# Altium footprint library lib_datalogger.PcbLib: 866 footprints (part 34 of 55)
Each footprint in its own frame and in the unit in brackets; x right, y up, seen from the top. Pads: shape width x height; smd on the part's side, far side on the other; paste and mask are expansions set on the pad; w line width, h text height; cw(c..) or ccw(c..) is an arc to the next point about the centre after c.
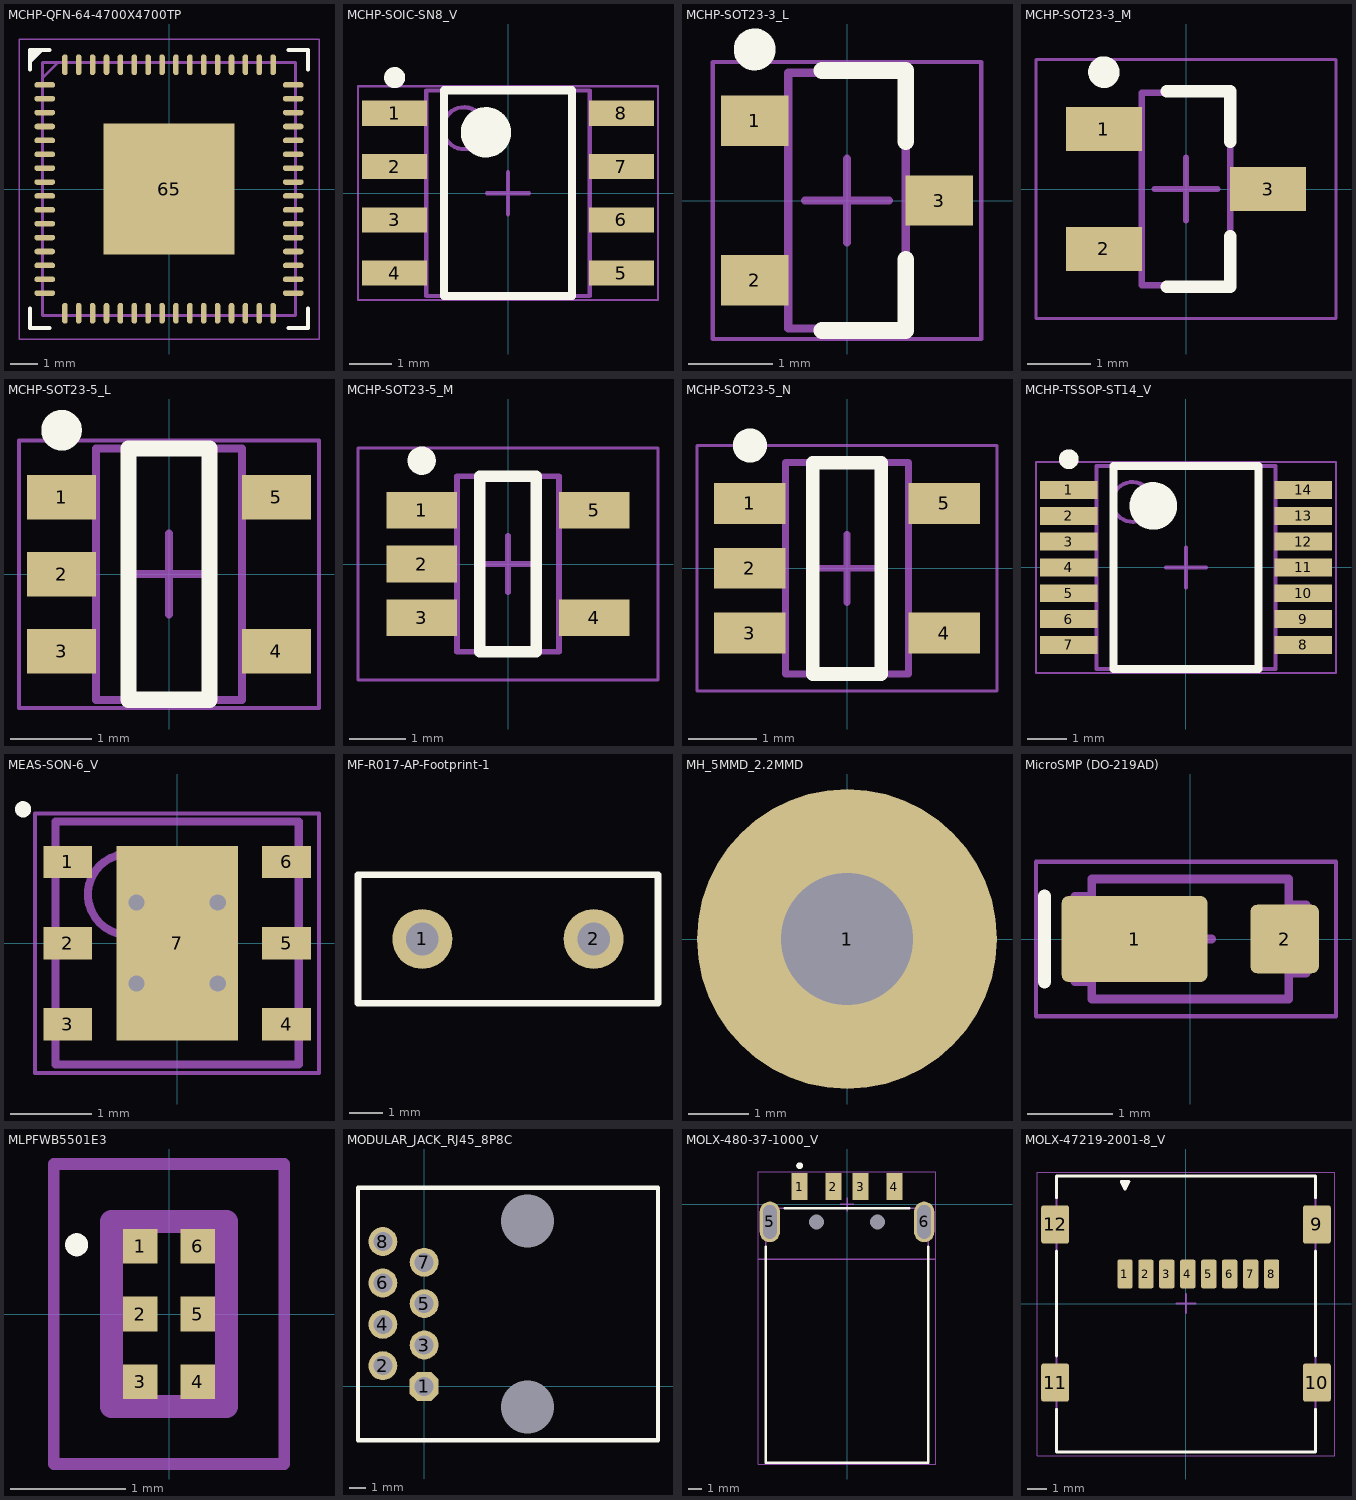
[diagram p33: the footprints below, top view; thin cyan lines are the x and y axes]

## MCHP-QFN-64-4700X4700TP [mm] "QFN, 64-Leads, Body 9.1x9.1mm, Pitch 0.5mm, Thermal Pad 4.7x4.7mm"
height 1
pads (65):
  oval 0.75x0.2 smd: 1(-4.475,3.75) 2(-4.475,3.25) 3(-4.475,2.75) 4(-4.475,2.25) 5(-4.475,1.75) 6(-4.475,1.25) 7(-4.475,0.75) 8(-4.475,0.25) 9(-4.475,-0.25) 10(-4.475,-0.75) 11(-4.475,-1.25) 12(-4.475,-1.75) 13(-4.475,-2.25) 14(-4.475,-2.75) 15(-4.475,-3.25) 16(-4.475,-3.75) 33(4.475,-3.75) 34(4.475,-3.25) 35(4.475,-2.75) 36(4.475,-2.25) 37(4.475,-1.75) 38(4.475,-1.25) 39(4.475,-0.75) 40(4.475,-0.25) 41(4.475,0.25) 42(4.475,0.75) 43(4.475,1.25) 44(4.475,1.75) 45(4.475,2.25) 46(4.475,2.75) 47(4.475,3.25) 48(4.475,3.75)
  oval 0.2x0.75 smd: 17(-3.75,-4.475) 18(-3.25,-4.475) 19(-2.75,-4.475) 20(-2.25,-4.475) 21(-1.75,-4.475) 22(-1.25,-4.475) 23(-0.75,-4.475) 24(-0.25,-4.475) 25(0.25,-4.475) 26(0.75,-4.475) 27(1.25,-4.475) 28(1.75,-4.475) 29(2.25,-4.475) 30(2.75,-4.475) 31(3.25,-4.475) 32(3.75,-4.475) 49(3.75,4.475) 50(3.25,4.475) 51(2.75,4.475) 52(2.25,4.475) 53(1.75,4.475) 54(1.25,4.475) 55(0.75,4.475) 56(0.25,4.475) 57(-0.25,4.475) 58(-0.75,4.475) 59(-1.25,4.475) 60(-1.75,4.475) 61(-2.25,4.475) 62(-2.75,4.475) 63(-3.25,4.475) 64(-3.75,4.475)
  rect 4.7x4.7 smd: 65(0,0)
Top Overlay:
  region: -5,5 -5,4.6 -4.6,5
  lines w0.15: -5,-4.3 -5,-5 -4.3,-5 ; -5,4.3 -5,5 -4.3,5 ; -5,4.6 -4.6,5 ; 4.3,-5 5,-5 5,-4.3 ; 4.3,5 5,5 5,4.3
Mechanical 13:
  lines w0.1: -4.55,4 -4,4.55 ; -4.55,-4.55 4.55,-4.55 4.55,4.55 -4.55,4.55 -4.55,-4.55
Mechanical 15:
  lines w0.05: -5.4,-5.4 5.4,-5.4 5.4,5.4 -5.4,5.4 -5.4,-5.4
  lines w0.1: -0.5,0 0.5,0 ; 0,-0.5 0,0.5
Top Designator:
  text ".Designator" at -1.778,3.175 h0.6
3D body "QFN64-9x9-pad4d7.step": height 0.9, standoff 0, extent -4.51,-4.51 4.51,4.51

## MCHP-SOIC-SN8_V [mm] "SOIC, 8-Leads, Body 4.90x3.90mm, Pitch 1.27mm"
height 1.75
pads (8):
  rect 1.55x0.6 smd: 1(-2.7,1.905) 2(-2.7,0.635) 3(-2.7,-0.635) 4(-2.7,-1.905) 5(2.7,-1.905) 6(2.7,-0.635) 7(2.7,0.635) 8(2.7,1.905)
Top Overlay:
  circle w0.25: c-2.7,2.755 r0.125
  circle w0.6: c-0.525,1.45 r0.3
  lines w0.2: -1.525,-2.45 -1.525,2.45 1.525,2.45 1.525,-2.45 -1.525,-2.45
Mechanical 13:
  circle w0.1: c-1.05,1.55 r0.5
  lines w0.1: -1.95,-2.45 -1.95,2.45 1.95,2.45 1.95,-2.45 -1.95,-2.45
Mechanical 15:
  lines w0.05: -3.575,-2.55 -3.575,2.55 3.575,2.55 3.575,-2.55 -3.575,-2.55
  lines w0.1: -0.5,0 0.5,0 ; 0,-0.5 0,0.5
3D body "SOIC127P600X175-8L.step": height 1.75, standoff 0, extent -3.01,-2.45 3.01,2.45

## MCHP-SOT23-3_L [mm] "SOT23, 3-Leads, Body 3.05x1.4mm, Pitch 0.95mm, IPC High Density"
height 1.12
pads (3):
  rect 0.8x0.6 smd: 1(-1.1,0.95) 2(-1.1,-0.95) 3(1.1,0)
Top Overlay:
  circle w0.25: c-1.1,1.8 r0.125
  lines w0.2: -0.3,-1.55 0.7,-1.55 0.7,-0.7 ; -0.3,1.55 0.7,1.55 0.7,0.7
Mechanical 13:
  lines w0.1: -0.7,-1.525 0.7,-1.525 0.7,1.525 -0.7,1.525 -0.7,-1.525
Mechanical 15:
  lines w0.05: -1.6,-1.65 1.6,-1.65 1.6,1.65 -1.6,1.65 -1.6,-1.65
  lines w0.1: -0.5,0 0.5,0 ; 0,-0.5 0,0.5
3D body "SOT95P237X112-3N.step": height 1.12, standoff 0, extent -1.39,-1.525 1.39,1.525

## MCHP-SOT23-3_M [mm] "SOT23, 3-Leads, Body 3.05x1.4mm, Pitch 0.95mm, IPC Low Density"
height 1.12
pads (3):
  rect 1.2x0.7 smd: 1(-1.3,0.95) 2(-1.3,-0.95) 3(1.3,0)
Top Overlay:
  circle w0.25: c-1.3,1.85 r0.125
  lines w0.2: -0.3,-1.55 0.7,-1.55 0.7,-0.75 ; -0.3,1.55 0.7,1.55 0.7,0.75
Mechanical 13:
  lines w0.1: -0.7,-1.525 0.7,-1.525 0.7,1.525 -0.7,1.525 -0.7,-1.525
Mechanical 15:
  lines w0.05: -2.375,-2.05 2.375,-2.05 2.375,2.05 -2.375,2.05 -2.375,-2.05
  lines w0.1: -0.5,0 0.5,0 ; 0,-0.5 0,0.5
3D body "SOT95P237X112-3N.step": height 1.12, standoff 0, extent -1.39,-1.525 1.39,1.525

## MCHP-SOT23-5_L [mm] "SOT23, 5-Leads, Body 3.10x1.80mm, Pitch 0.95mm, IPC High Density"
height 1.45
pads (5):
  rect 0.85x0.55 smd: 1(-1.325,0.95) 2(-1.325,0) 3(-1.325,-0.95) 4(1.325,-0.95) 5(1.325,0.95)
Top Overlay:
  circle w0.25: c-1.325,1.775 r0.125
  lines w0.2: -0.5,-1.55 0.5,-1.55 0.5,1.55 -0.5,1.55 -0.5,-1.55
Mechanical 13:
  lines w0.1: -0.9,-1.55 -0.9,1.55 0.9,1.55 0.9,-1.55 -0.9,-1.55
Mechanical 15:
  lines w0.05: -1.85,-1.65 -1.85,1.65 1.85,1.65 1.85,-1.65 -1.85,-1.65
  lines w0.1: -0.5,0 0.5,0 ; 0,-0.5 0,0.5
3D body "SOT95P270X145-5L.step": height 1.45, standoff 0, extent -1.7,-1.55 1.7,1.55

## MCHP-SOT23-5_M [mm] "SOT23, 5-Leads, Body 3.10x1.80mm, Pitch 0.95mm, IPC Low Density"
height 1.45
pads (5):
  rect 1.25x0.65 smd: 1(-1.525,0.95) 2(-1.525,0) 3(-1.525,-0.95) 4(1.525,-0.95) 5(1.525,0.95)
Top Overlay:
  circle w0.25: c-1.525,1.825 r0.125
  lines w0.2: -0.5,-1.55 -0.5,1.55 0.5,1.55 0.5,-1.55 -0.5,-1.55
Mechanical 13:
  lines w0.1: -0.9,-1.55 0.9,-1.55 0.9,1.55 -0.9,1.55 -0.9,-1.55
Mechanical 15:
  lines w0.05: -2.65,-2.05 2.65,-2.05 2.65,2.05 -2.65,2.05 -2.65,-2.05
  lines w0.1: -0.5,0 0.5,0 ; 0,-0.5 0,0.5
3D body "SOT95P270X145-5M.step": height 1.45, standoff 0, extent -1.7,-1.55 1.7,1.55

## MCHP-SOT23-5_N [mm] "SOT23, 5-Leads, Body 3.10x1.80mm, Pitch 0.95mm, IPC Medium Density"
height 1.45
pads (5):
  rect 1.05x0.6 smd: 1(-1.425,0.95) 2(-1.425,0) 3(-1.425,-0.95) 4(1.425,-0.95) 5(1.425,0.95)
Top Overlay:
  circle w0.25: c-1.425,1.8 r0.125
  lines w0.2: -0.5,-1.55 -0.5,1.55 0.5,1.55 0.5,-1.55 -0.5,-1.55
Mechanical 13:
  lines w0.1: -0.9,-1.55 0.9,-1.55 0.9,1.55 -0.9,1.55 -0.9,-1.55
Mechanical 15:
  lines w0.05: -2.2,-1.8 2.2,-1.8 2.2,1.8 -2.2,1.8 -2.2,-1.8
  lines w0.1: -0.5,0 0.5,0 ; 0,-0.5 0,0.5
3D body "SOT95P270X145-5N.step": height 1.45, standoff 0, extent -1.7,-1.55 1.7,1.55

## MCHP-TSSOP-ST14_V [mm] "TSSOP, 14-Leads, Body 5.1x4.5mm, Pitch 0.65mm"
height 1.2
pads (14):
  rect 1.45x0.45 smd: 1(-2.95,1.95) 2(-2.95,1.3) 3(-2.95,0.65) 4(-2.95,0) 5(-2.95,-0.65) 6(-2.95,-1.3) 7(-2.95,-1.95) 8(2.95,-1.95) 9(2.95,-1.3) 10(2.95,-0.65) 11(2.95,0) 12(2.95,0.65) 13(2.95,1.3) 14(2.95,1.95)
Top Overlay:
  circle w0.6: c-0.825,1.55 r0.3
  circle w0.25: c-2.95,2.725 r0.125
  lines w0.2: -1.825,-2.55 1.825,-2.55 1.825,2.55 -1.825,2.55 -1.825,-2.55
Mechanical 13:
  circle w0.1: c-1.35,1.65 r0.5
  lines w0.1: -2.25,-2.55 2.25,-2.55 2.25,2.55 -2.25,2.55 -2.25,-2.55
Mechanical 15:
  lines w0.05: -3.775,-2.65 3.775,-2.65 3.775,2.65 -3.775,2.65 -3.775,-2.65
  lines w0.1: -0.5,0 0.5,0 ; 0,-0.5 0,0.5
3D body "TSOP65P640X120-14L.step": height 1.2, standoff 0, extent -3.2,-2.55 3.2,2.55

## MEAS-SON-6_V [mm] "SON, 6-Leads, Body 3x3mm, Pitch 1mm, Thermal Pad 2.4x1.5mm"
height 0.9
pads (7):
  rect 0.6x0.4 smd: 1(-1.35,1) 2(-1.35,0) 3(-1.35,-1) 4(1.35,-1) 5(1.35,0) 6(1.35,1)
  rect 1.5x2.4 smd: 7(0,0)
via -0.5,0.5 diameter 0.5 hole 0.2
via 0.5,0.5 diameter 0.5 hole 0.2
via -0.5,-0.5 diameter 0.5 hole 0.2
via 0.5,-0.5 diameter 0.5 hole 0.2
Top Overlay:
  circle w0.1: c-1.9,1.65 r0.05
Mechanical 13:
  circle w0.1: c-0.6,0.6 r0.5
  lines w0.1: -1.5,-1.5 -1.5,1.5 1.5,1.5 1.5,-1.5 -1.5,-1.5
Mechanical 15:
  lines w0.05: -1.75,-1.6 -1.75,1.6 1.75,1.6 1.75,-1.6 -1.75,-1.6
  lines w0.1: -0.5,0 0.5,0 ; 0,-0.5 0,0.5
3D body "SON_MEAS-SON-6.stp": height 0.9, standoff 0, extent -1.5,-1.5 1.5,1.5

## MF-R017-AP-Footprint-1 [mil]
pads (2):
  round 70 hole 38: 1(185,745) 2(385,745)
Top Overlay:
  lines w7.87: 110,670 460,670 460,820 110,820 110,670
3D body "User Library-Resettable PTC Radial.STEP": height 507.32, standoff -117.24, extent 130,691.57 441.02,790

## MH_5MMD_2.2MMD [mm]
pads (1):
  round 5 / inner round 3.683 / far side round 5 hole 2.2: 1(0,0)

## MicroSMP (DO-219AD) [mm] "SOD, 2-Leads, Body 2.3x1.4mm"
height 0.73
pads (2):
  rrect15% 1.7x1 smd: 1(-0.65,0)
  rrect20% 0.8x0.8 smd: 2(1.1,0)
Top Overlay:
  lines w0.15: -1.7,-0.5 -1.7,0.5
Mechanical 13:
  lines w0.1: -1.15,-0.5 -1.35,-0.5 -1.35,0.5 -1.15,0.5 ; 1.15,-0.4 1.35,-0.4 1.35,0.4 1.15,0.4 ; -1.15,-0.7 1.15,-0.7 1.15,0.7 -1.15,0.7 -1.15,-0.7
Mechanical 15:
  lines w0.05: -1.8,-0.9 1.7,-0.9 1.7,0.9 -1.8,0.9 -1.8,-0.9
  lines w0.1: -0.25,0 0.25,0 ; 0,-0.25 0,0.25
Top Designator:
  text ".Designator" at -1.27,0.889 h0.6
3D body "User Library-MicroSMP.STEP": height 0.73, standoff 0, extent -1.35,-0.7 1.35,0.7

## MLPFWB5501E3 [mm]
pads (6):
  rect 0.3x0.3 smd: 1(-0.25,0.587) 2(-0.25,0) 3(-0.25,-0.587) 4(0.25,-0.587) 5(0.25,0) 6(0.25,0.587)
Top Overlay:
  lines w0.1: -0.8,0.55 cw(c-0.8,0.6) -0.8,0.65 cw(c-0.8,0.6) -0.8,0.55
Mechanical 13:
  lines w0.2: -0.5,-0.8 0.5,-0.8 0.5,0.8 -0.5,0.8 -0.5,-0.8
Mechanical 15:
  lines w0.1: -1,-1.3 1,-1.3 1,1.3 -1,1.3 -1,-1.3
3D body "MLPF-WB55-01E3.stp": height 0.8, standoff 0, extent -0.5,-0.8 0.5,0.8

## MODULAR_JACK_RJ45_8P8C [mil]
pads (10):
  oct 70x70 hole 46: 1(0,0)
  round 70 hole 46: 2(-100,50) 3(0,100) 4(-100,150) 5(0,200) 6(-100,250) 7(0,300) 8(-100,350)
  round 0 hole 128: 9(250,-50) 10(250,400)
Top Overlay:
  lines w10: -160,-130 -160,480 565,480 565,-130 -160,-130
3D body "c-5555164-1-a-3d.stp": height 547.5, standoff -97.5, extent -155,-126.5 560,476.5

## MOLX-480-37-1000_V [mm] "CONN, 4-Leads, Body 12x18.8mm"
height 4.6
pads (8):
  rect 1.2x2 smd: 1(-3.5,1.3) 2(-1,1.3) 3(1,1.3) 4(3.5,1.3)
  oval 1.5x3 hole 1 slot 2.5 at 90 deg: 5(-5.7,-1.3) 6(5.7,-1.3)
  round 0.5 hole 1.1 unplated: MH1(-2.25,-1.3) MH2(2.25,-1.3)
Top Overlay:
  circle w0.25: c-3.5,2.85 r0.125
  lines w0.2: -6,-3.16 -6,-19.1 6,-19.1 6,-3.16 ; -4.577,-0.3 4.577,-0.3
Mechanical 1:
  lines w0.1: -6.5,-4.05 6.5,-4.05
  text "PCB EDGE" at 1.27,-3.84 h0.5
Mechanical 13:
  lines w0.1: -6,-19.1 -6,-0.3 6,-0.3 6,-19.1 -6,-19.1
Mechanical 15:
  lines w0.05: -6.55,-19.182 6.55,-19.182 6.55,2.4 -6.55,2.4 -6.55,-19.182
  lines w0.1: -0.5,0 0.5,0 ; 0,-0.5 0,0.5
3D body "480371000.stp": height 3.07, standoff -2.9, extent -6.348,-19.082 6.348,2.198

## MOLX-47219-2001-8_V [mm] "CONN, 8-Leads, Body 14.5x13.6mm, Pitch 1.1mm"
height 1.9
pads (12):
  rrect20% 0.8x1.5 smd: 1(-3.205,1.55) 2(-2.105,1.55) 3(-1.005,1.55) 4(0.095,1.55) 5(1.195,1.55) 6(2.295,1.55) 7(3.395,1.55) 8(4.495,1.55)
  rrect15% 1.45x2 smd: 9(6.875,4.15) 10(6.875,-4.15) 11(-6.875,-4.15) 12(-6.875,4.15)
Top Overlay:
  region: -3,6.4 -3.4,6.4 -3.2,6
  lines w0.15: -6.8,-5.55 -6.8,-7.8 6.8,-7.8 6.8,-5.55 ; -6.8,-2.75 -6.8,2.75 ; -6.8,5.55 -6.8,6.7 6.8,6.7 6.8,5.55 ; 6.8,-2.75 6.8,2.75 ; -3.4,6.4 -3.2,6 -3,6.4 -3.4,6.4
Mechanical 13:
  lines w0.1: -6.8,-7.8 6.8,-7.8 6.8,6.7 -6.8,6.7 -6.8,-7.8
Mechanical 15:
  lines w0.05: -7.8,-8 7.8,-8 7.8,6.9 -7.8,6.9 -7.8,-8
  lines w0.1: -0.5,0 0.5,0 ; 0,-0.5 0,0.5
Top Designator:
  text ".Designator" at -1.397,-2.032 h0.6
3D body "472192001.stp": height 1.91, standoff 0.02, extent -7.3,-7.793 7.3,6.707